# Altium footprint library mfmc_footprints.PcbLib: 156 footprints (part 3 of 10)
Each footprint in its own frame and in the unit in brackets; x right, y up, seen from the top. Pads: shape width x height; smd on the part's side, far side on the other; paste and mask are expansions set on the pad; w line width, h text height; cw(c..) or ccw(c..) is an arc to the next point about the centre after c.
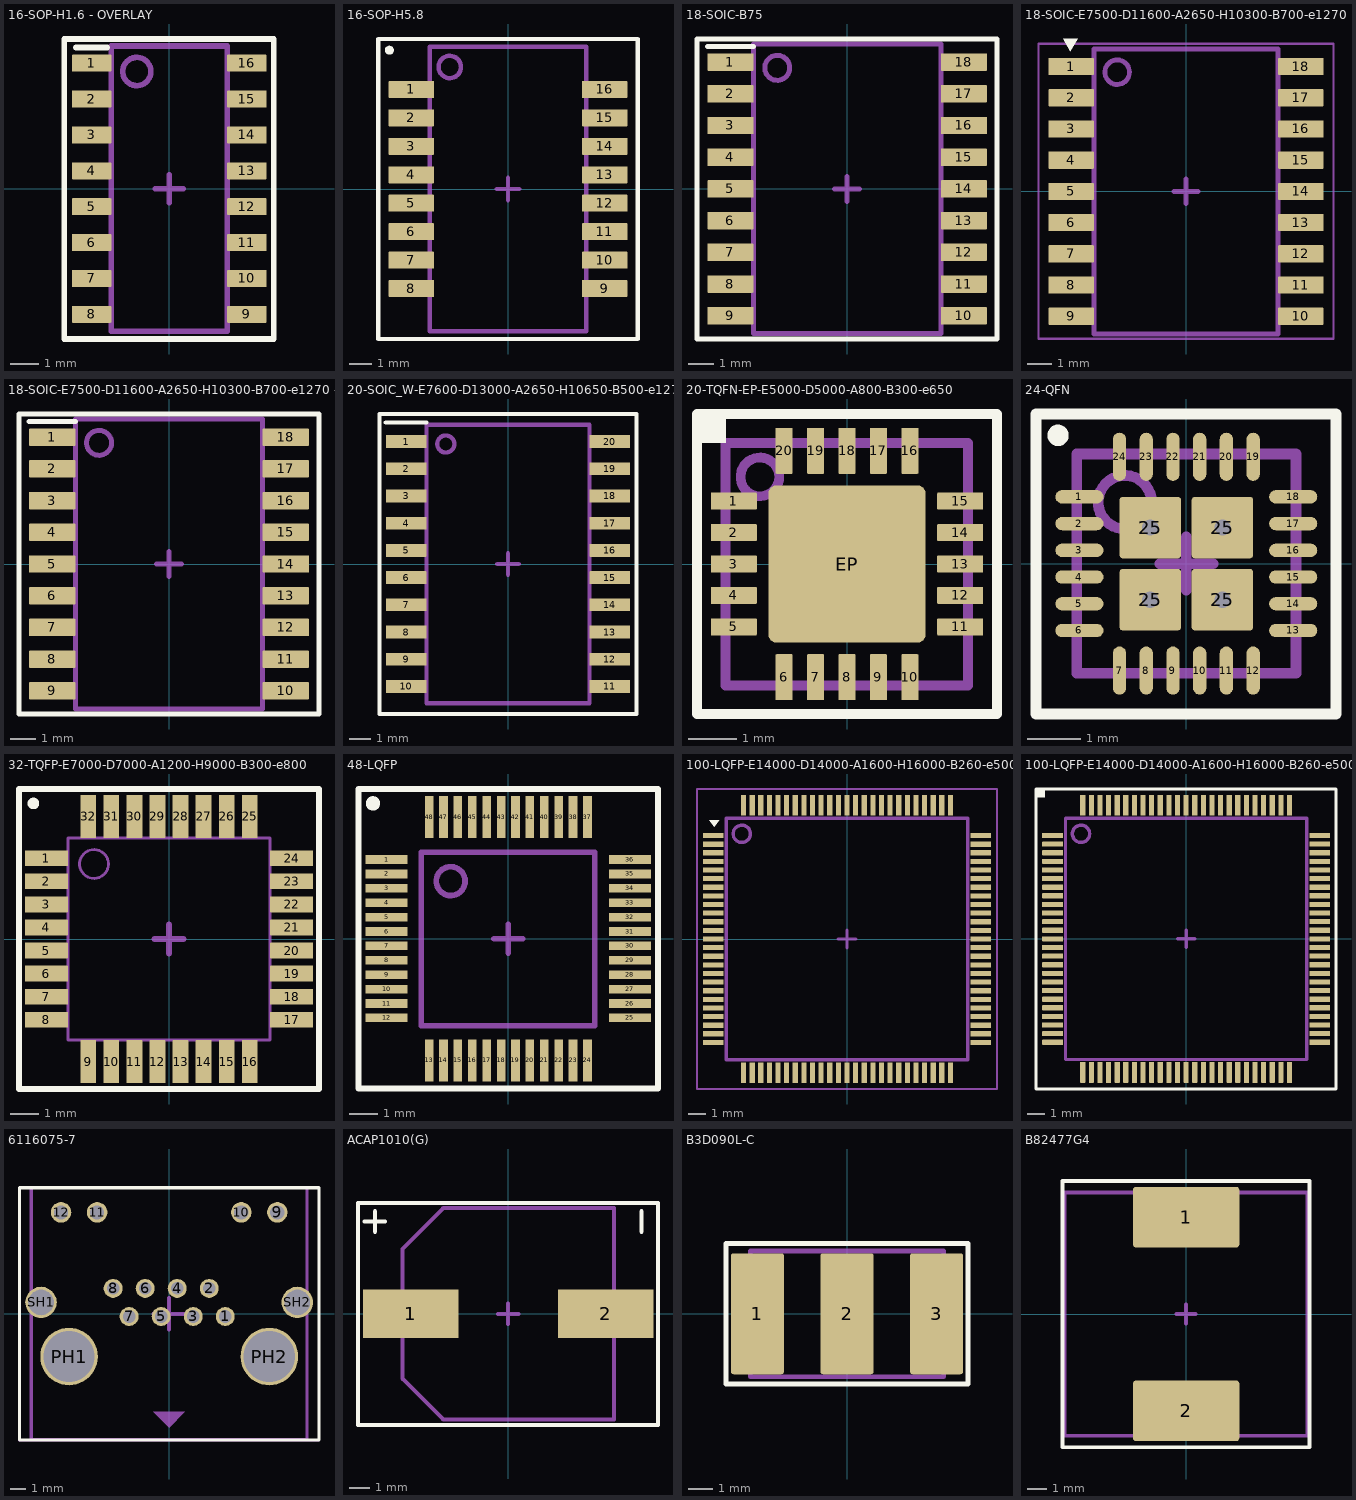
[diagram p2: the footprints below, top view; thin cyan lines are the x and y axes]

## 16-SOP-H1.6 - OVERLAY [mm] "TSOP, 16-Leads, Body 9,90x3,90mm, Pitch 1,27mm, IPC Medium Density"
height 1.6
pads (16):
  rrect10% 1.4x0.6 smd: 1(-2.75,4.445) 2(-2.75,3.175) 3(-2.75,1.905) 4(-2.75,0.635) 5(-2.75,-0.635) 6(-2.75,-1.905) 7(-2.75,-3.175) 8(-2.75,-4.445) 9(2.75,-4.445) 10(2.75,-3.175) 11(2.75,-1.905) 12(2.75,-0.635) 13(2.75,0.635) 14(2.75,1.905) 15(2.75,3.175) 16(2.75,4.445)
Top Overlay:
  lines w0.2: -3.3,5 -2.2,5 ; -3.719,-5.319 -3.719,5.3 3.7,5.3 3.7,-5.319 -3.719,-5.319
Top Courtyard:
  lines w0.1: -3.7,-5.3 -3.7,5.3 3.7,5.3 3.7,-5.3 -3.7,-5.3
  lines w0.2: -0.5,0 0.5,0 ; 0,-0.5 0,0.5
Top Assembly:
  circle w0.2: c-1.15,4.15 r0.5
  lines w0.2: -2.05,-5.05 2.05,-5.05 2.05,5.05 -2.05,5.05 -2.05,-5.05
Top Designator (Mech10):
  text ".Designator" at -7.627,-0.517 h1.52
3D body "TSOP127P600X160-16N.step": height 1.6, standoff 0, extent -3,-5.05 3,5.05

## 16-SOP-H5.8 [mm] "SOP, 16-Leads, Body 12,70x7,00mm, Pitch 1,27mm, IPC Medium Density"
height 5.8
pads (16):
  rrect10% 2.03x0.76 smd: 1(-4.32,4.445) 2(-4.32,3.175) 3(-4.32,1.905) 4(-4.32,0.635) 5(-4.32,-0.635) 6(-4.32,-1.905) 7(-4.32,-3.175) 8(-4.32,-4.445) 9(4.32,-4.445) 10(4.32,-3.175) 11(4.32,-1.905) 12(4.32,-0.635) 13(4.32,0.635) 14(4.32,1.905) 15(4.32,3.175) 16(4.32,4.445)
Top Overlay:
  circle w0.2: c-5.3,6.2 r0.1
  lines w0.2: -5.8,-6.7 5.8,-6.7 5.8,6.7 -5.8,6.7 -5.8,-6.7
Top Courtyard:
  lines w0.1: -5.8,-6.7 -5.8,6.7 5.8,6.7 5.8,-6.7 -5.8,-6.7
  lines w0.2: -0.5,0 0.5,0 ; 0,-0.5 0,0.5
Top Assembly:
  circle w0.2: c-2.6,5.45 r0.5
  lines w0.2: -3.5,-6.35 3.5,-6.35 3.5,6.35 -3.5,6.35 -3.5,-6.35
Top Designator (Mech10):
  text ".Designator" at -7.618,-0.508 h1.52
3D body "SOP127P950X580-16N.step": height 5.8, standoff 0, extent -4.75,-6.35 4.75,6.35

## 18-SOIC-B75 [mm] "SOIC, 18-Leads, Body 11,60x7,50mm, Pitch 1,27mm, IPC Medium Density"
height 2.65
pads (18):
  rrect10% 1.85x0.7 smd: 1(-4.675,5.08) 2(-4.675,3.81) 3(-4.675,2.54) 4(-4.675,1.27) 5(-4.675,0) 6(-4.675,-1.27) 7(-4.675,-2.54) 8(-4.675,-3.81) 9(-4.675,-5.08) 10(4.675,-5.08) 11(4.675,-3.81) 12(4.675,-2.54) 13(4.675,-1.27) 14(4.675,0) 15(4.675,1.27) 16(4.675,2.54) 17(4.675,3.81) 18(4.675,5.08)
Top Overlay:
  lines w0.2: -5.6,5.7 -3.75,5.7 ; -6.013,-6.013 6,-6.013 6,6 -6.013,6 -6.013,-6.013
Top Courtyard:
  lines w0.1: -6,-6 -6,6 6,6 6,-6 -6,-6
  lines w0.2: -0.5,0 0.5,0 ; 0,-0.5 0,0.5
Top Assembly:
  circle w0.2: c-2.8,4.85 r0.5
  lines w0.2: -3.75,-5.8 -3.75,5.8 3.75,5.8 3.75,-5.8 -3.75,-5.8
Top Designator (Mech10):
  text ".Designator" at -7.624,-0.514 h1.52
3D body "SOIC127P1030X265-18N.step": height 2.65, standoff 0, extent -5.15,-5.8 5.15,5.8

## 18-SOIC-E7500-D11600-A2650-H10300-B700-e1270 [mm] "SOIC, 18-Leads, Body 11,60x7,50mm, Pitch 1,27mm, IPC Medium Density"
height 2.65
pads (18):
  rrect10% 1.85x0.7 smd: 1(-4.675,5.08) 2(-4.675,3.81) 3(-4.675,2.54) 4(-4.675,1.27) 5(-4.675,0) 6(-4.675,-1.27) 7(-4.675,-2.54) 8(-4.675,-3.81) 9(-4.675,-5.08) 10(4.675,-5.08) 11(4.675,-3.81) 12(4.675,-2.54) 13(4.675,-1.27) 14(4.675,0) 15(4.675,1.27) 16(4.675,2.54) 17(4.675,3.81) 18(4.675,5.08)
Top Overlay:
  region: -4.7,5.7 -5,6.2 -4.4,6.2
Top Courtyard:
  lines w0.1: -6,-6 -6,6 6,6 6,-6 -6,-6
  lines w0.2: -0.5,0 0.5,0 ; 0,-0.5 0,0.5
Top Assembly:
  circle w0.2: c-2.8,4.85 r0.5
  lines w0.2: -3.75,-5.8 -3.75,5.8 3.75,5.8 3.75,-5.8 -3.75,-5.8
Top Designator (Mech10):
  text ".Designator" at -7.618,-0.433 h1.52
3D body "SOIC127P1030X265-18N.step": height 2.65, standoff 0, extent -5.15,-5.8 5.15,5.8

## 18-SOIC-E7500-D11600-A2650-H10300-B700-e1270 - OVERLAY [mm] "SOIC, 18-Leads, Body 11,60x7,50mm, Pitch 1,27mm, IPC Medium Density"
height 2.65
pads (18):
  rrect10% 1.85x0.7 smd: 1(-4.675,5.08) 2(-4.675,3.81) 3(-4.675,2.54) 4(-4.675,1.27) 5(-4.675,0) 6(-4.675,-1.27) 7(-4.675,-2.54) 8(-4.675,-3.81) 9(-4.675,-5.08) 10(4.675,-5.08) 11(4.675,-3.81) 12(4.675,-2.54) 13(4.675,-1.27) 14(4.675,0) 15(4.675,1.27) 16(4.675,2.54) 17(4.675,3.81) 18(4.675,5.08)
Top Overlay:
  lines w0.2: -5.6,5.7 -3.75,5.7 ; -6,-6 6,-6 6,6 -6,6 -6,-6
Top Courtyard:
  lines w0.1: -6,-6 6,-6 6,6 -6,6 -6,-6
  lines w0.2: -0.5,0 0.5,0 ; 0,-0.5 0,0.5
Top Assembly:
  circle w0.2: c-2.8,4.85 r0.5
  lines w0.2: -3.75,-5.8 3.75,-5.8 3.75,5.8 -3.75,5.8 -3.75,-5.8
Top Designator (Mech10):
  text ".Designator" at -7.618,-0.508 h1.52
3D body "SOIC127P1030X265-18N.step": height 2.65, standoff 0, extent -5.15,-5.8 5.15,5.8

## 20-SOIC_W-E7600-D13000-A2650-H10650-B500-e1270 [mm] "SOIC, 20-Leads, Body 12,80x7,50mm, Pitch 1,27mm, IPC Medium Density"
height 2.65
pads (20):
  rrect10% 1.9x0.6 smd: 1(-4.75,5.715) 2(-4.75,4.445) 3(-4.75,3.175) 4(-4.75,1.905) 5(-4.75,0.635) 6(-4.75,-0.635) 7(-4.75,-1.905) 8(-4.75,-3.175) 9(-4.75,-4.445) 10(-4.75,-5.715) 11(4.75,-5.715) 12(4.75,-4.445) 13(4.75,-3.175) 14(4.75,-1.905) 15(4.75,-0.635) 16(4.75,0.635) 17(4.75,1.905) 18(4.75,3.175) 19(4.75,4.445) 20(4.75,5.715)
Top Overlay:
  lines w0.2: -5.7,6.6 -3.8,6.6 ; -6,-7 6,-7 6,7 -6,7 -6,-7
Top Courtyard:
  lines w0.1: -6,-7 6,-7 6,7 -6,7 -6,-7
  lines w0.2: -0.5,0 0.5,0 ; 0,-0.5 0,0.5
Top Assembly:
  circle w0.2: c-2.9,5.6 r0.4
  lines w0.2: -3.8,-6.5 3.8,-6.5 3.8,6.5 -3.8,6.5 -3.8,-6.5
Top Designator (Mech10):
  text ".Designator" at -7.618,-0.508 h1.52
3D body "20-SOIC_W-E7600-D13000-A2650-H10650-B500-e1270.step": height 2.65, standoff 0, extent -5.162,-6.5 5.162,6.5

## 20-TQFN-EP-E5000-D5000-A800-B300-e650 [mm] "Thin QFN 5x5x0.75mm 20 leads"
height 0.8
pads (21):
  rrect10% 0.95x0.35 smd: 1(-2.34,1.3) 2(-2.34,0.65) 3(-2.34,0) 4(-2.34,-0.65) 5(-2.34,-1.3) 11(2.34,-1.3) 12(2.34,-0.65) 13(2.34,0) 14(2.34,0.65) 15(2.34,1.3)
  rrect10% 0.35x0.95 smd: 6(-1.3,-2.34) 7(-0.65,-2.34) 8(0,-2.34) 9(0.65,-2.34) 10(1.3,-2.34) 16(1.3,2.34) 17(0.65,2.34) 18(0,2.34) 19(-0.65,2.34) 20(-1.3,2.34)
  rrect10% 3.25x3.25 smd: EP(0,0)
Top Overlay:
  rectangle: -3.1,2.5 -2.5,3.1
  lines w0.2: -3.1,-3.1 -3.1,3.1 3.1,3.1 3.1,-3.1 -3.1,-3.1
Top Courtyard:
  lines w0.1: -3.1,-3.1 -3.1,3.1 3.1,3.1 3.1,-3.1 -3.1,-3.1
  lines w0.2: -0.5,0 0.5,0 ; 0,-0.5 0,0.5
Top Assembly:
  circle w0.2: c-1.8,1.8 r0.4
  lines w0.2: -2.513,-2.513 2.5,-2.513 2.5,2.5 -2.513,2.5 -2.513,-2.513
Top Designator (Mech10):
  text ".Designator" at -7.618,-0.508 h1.52
3D body "User Library-Maxim_TQFN20.STEP": height 0.76, standoff 0.01, extent -2.51,-2.51 2.51,2.51

## 24-QFN [mm] "QFN, 24-Leads, Body 4,00x4,00mm, Pitch 0,50mm, Thermal Pad 2,50x2,50mm, IPC Medium Density"
height 0.85
pads (28):
  oval 0.9x0.25 smd: 1(-2,1.25) 2(-2,0.75) 3(-2,0.25) 4(-2,-0.25) 5(-2,-0.75) 6(-2,-1.25) 13(2,-1.25) 14(2,-0.75) 15(2,-0.25) 16(2,0.25) 17(2,0.75) 18(2,1.25)
  oval 0.25x0.9 smd: 7(-1.25,-2) 8(-0.75,-2) 9(-0.25,-2) 10(0.25,-2) 11(0.75,-2) 12(1.25,-2) 19(1.25,2) 20(0.75,2) 21(0.25,2) 22(-0.25,2) 23(-0.75,2) 24(-1.25,2)
  rrect10% 1.15x1.15 smd: 25(-0.675,-0.675) 25(-0.675,0.675) 25(0.675,-0.675) 25(0.675,0.675)
via 0.675,0.675 diameter 0.7 hole 0.3
via 0.675,-0.675 diameter 0.7 hole 0.3
via -0.675,-0.675 diameter 0.7 hole 0.3
via -0.675,0.675 diameter 0.7 hole 0.3
Top Overlay:
  circle w0.2: c-2.4,2.4 r0.1
  lines w0.2: -2.813,-2.813 2.8,-2.813 2.8,2.8 -2.813,2.8 -2.813,-2.813
Top Courtyard:
  lines w0.1: -2.8,-2.8 2.8,-2.8 2.8,2.8 -2.8,2.8 -2.8,-2.8
  lines w0.2: -0.5,0 0.5,0 ; 0,-0.5 0,0.5
Top Assembly:
  circle w0.2: c-1.15,1.15 r0.5
  lines w0.2: -2.05,-2.05 2.05,-2.05 2.05,2.05 -2.05,2.05 -2.05,-2.05
Top Designator (Mech10):
  text ".Designator" at -7.624,-0.514 h1.52
3D body "QFN50P400X400X85_HS-25N.step": height 0.85, standoff 0, extent -2.1,-2.1 2.1,2.1

## 32-TQFP-E7000-D7000-A1200-H9000-B300-e800 [mm] "TQFP, 32-Leads, Body 7,00x7,00mm, Pitch 0,80mm, IPC Medium Density"
height 1.2
pads (32):
  rrect10% 1.5x0.55 smd: 1(-4.25,2.8) 2(-4.25,2) 3(-4.25,1.2) 4(-4.25,0.4) 5(-4.25,-0.4) 6(-4.25,-1.2) 7(-4.25,-2) 8(-4.25,-2.8) 17(4.25,-2.8) 18(4.25,-2) 19(4.25,-1.2) 20(4.25,-0.4) 21(4.25,0.4) 22(4.25,1.2) 23(4.25,2) 24(4.25,2.8)
  rrect10% 0.55x1.5 smd: 9(-2.8,-4.25) 10(-2,-4.25) 11(-1.2,-4.25) 12(-0.4,-4.25) 13(0.4,-4.25) 14(1.2,-4.25) 15(2,-4.25) 16(2.8,-4.25) 25(2.8,4.25) 26(2,4.25) 27(1.2,4.25) 28(0.4,4.25) 29(-0.4,4.25) 30(-1.2,4.25) 31(-2,4.25) 32(-2.8,4.25)
Top Overlay:
  circle w0.2: c-4.7,4.7 r0.1
  lines w0.2: -5.2,-5.2 5.2,-5.2 5.2,5.2 -5.2,5.2 -5.2,-5.2
Top Courtyard:
  lines w0.1: -5.2,-5.2 -5.2,5.2 5.2,5.2 5.2,-5.2 -5.2,-5.2
  lines w0.2: -0.5,0 0.5,0 ; 0,-0.5 0,0.5
Top Assembly:
  circle w0.1: c-2.6,2.6 r0.5
  lines w0.1: -3.5,-3.5 -3.5,3.5 3.5,3.5 3.5,-3.5 -3.5,-3.5
Top Designator (Mech10):
  text ".Designator" at -7.618,-0.508 h1.52
3D body "32-TQFP-E7000-D7000-A1200-H9000-B300-e800.step": height 1.05, standoff 0, extent -4.625,-4.625 4.625,4.625

## 48-LQFP [mm] "TSQFP, 48-Leads, Body 7,00x7,00mm, Pitch 0,50mm, IPC Medium Density"
height 1.6
pads (48):
  rect 1.45x0.3 smd: 1(-4.225,2.75) 2(-4.225,2.25) 3(-4.225,1.75) 4(-4.225,1.25) 5(-4.225,0.75) 6(-4.225,0.25) 7(-4.225,-0.25) 8(-4.225,-0.75) 9(-4.225,-1.25) 10(-4.225,-1.75) 11(-4.225,-2.25) 12(-4.225,-2.75) 25(4.225,-2.75) 26(4.225,-2.25) 27(4.225,-1.75) 28(4.225,-1.25) 29(4.225,-0.75) 30(4.225,-0.25) 31(4.225,0.25) 32(4.225,0.75) 33(4.225,1.25) 34(4.225,1.75) 35(4.225,2.25) 36(4.225,2.75)
  rect 0.3x1.45 smd: 13(-2.75,-4.225) 14(-2.25,-4.225) 15(-1.75,-4.225) 16(-1.25,-4.225) 17(-0.75,-4.225) 18(-0.25,-4.225) 19(0.25,-4.225) 20(0.75,-4.225) 21(1.25,-4.225) 22(1.75,-4.225) 23(2.25,-4.225) 24(2.75,-4.225) 37(2.75,4.225) 38(2.25,4.225) 39(1.75,4.225) 40(1.25,4.225) 41(0.75,4.225) 42(0.25,4.225) 43(-0.25,4.225) 44(-0.75,4.225) 45(-1.25,4.225) 46(-1.75,4.225) 47(-2.25,4.225) 48(-2.75,4.225)
Top Overlay:
  circle w0.25: c-4.7,4.7 r0.125
  lines w0.2: -5.2,-5.2 -5.2,5.2 5.2,5.2 5.2,-5.2 -5.2,-5.2
Top Courtyard:
  lines w0.1: -5.219,-5.219 5.2,-5.219 5.2,5.2 -5.219,5.2 -5.219,-5.219
  lines w0.2: -0.5,0 0.5,0 ; 0,-0.5 0,0.5
Top Assembly:
  circle w0.2: c-2,2 r0.5
  lines w0.2: -3.019,-3.019 3,-3.019 3,3 -3.019,3 -3.019,-3.019
Top Designator (Mech10):
  text ".Designator" at -7.618,-0.508 h1.52
3D body "TSQFP50P900X900X160-48N.step": height 1.6, standoff 0, extent -4.5,-4.5 4.5,4.5

## 100-LQFP-E14000-D14000-A1600-H16000-B260-e500 [mm] "TSQFP, 100-Leads, Body 14,00x14,00mm, Pitch 0,50mm, IPC Medium Density"
height 1.6
pads (100):
  rrect10% 1.2x0.3 smd: 1(-7.75,6) 2(-7.75,5.5) 3(-7.75,5) 4(-7.75,4.5) 5(-7.75,4) 6(-7.75,3.5) 7(-7.75,3) 8(-7.75,2.5) 9(-7.75,2) 10(-7.75,1.5) 11(-7.75,1) 12(-7.75,0.5) 13(-7.75,0) 14(-7.75,-0.5) 15(-7.75,-1) 16(-7.75,-1.5) 17(-7.75,-2) 18(-7.75,-2.5) 19(-7.75,-3) 20(-7.75,-3.5) 21(-7.75,-4) 22(-7.75,-4.5) 23(-7.75,-5) 24(-7.75,-5.5) 25(-7.75,-6) 51(7.75,-6) 52(7.75,-5.5) 53(7.75,-5) 54(7.75,-4.5) 55(7.75,-4) 56(7.75,-3.5) 57(7.75,-3) 58(7.75,-2.5) 59(7.75,-2) 60(7.75,-1.5) 61(7.75,-1) 62(7.75,-0.5) 63(7.75,0) 64(7.75,0.5) 65(7.75,1) 66(7.75,1.5) 67(7.75,2) 68(7.75,2.5) 69(7.75,3) 70(7.75,3.5) 71(7.75,4) 72(7.75,4.5) 73(7.75,5) 74(7.75,5.5) 75(7.75,6)
  rrect10% 0.3x1.2 smd: 26(-6,-7.75) 27(-5.5,-7.75) 28(-5,-7.75) 29(-4.5,-7.75) 30(-4,-7.75) 31(-3.5,-7.75) 32(-3,-7.75) 33(-2.5,-7.75) 34(-2,-7.75) 35(-1.5,-7.75) 36(-1,-7.75) 37(-0.5,-7.75) 38(0,-7.75) 39(0.5,-7.75) 40(1,-7.75) 41(1.5,-7.75) 42(2,-7.75) 43(2.5,-7.75) 44(3,-7.75) 45(3.5,-7.75) 46(4,-7.75) 47(4.5,-7.75) 48(5,-7.75) 49(5.5,-7.75) 50(6,-7.75) 76(6,7.75) 77(5.5,7.75) 78(5,7.75) 79(4.5,7.75) 80(4,7.75) 81(3.5,7.75) 82(3,7.75) 83(2.5,7.75) 84(2,7.75) 85(1.5,7.75) 86(1,7.75) 87(0.5,7.75) 88(0,7.75) 89(-0.5,7.75) 90(-1,7.75) 91(-1.5,7.75) 92(-2,7.75) 93(-2.5,7.75) 94(-3,7.75) 95(-3.5,7.75) 96(-4,7.75) 97(-4.5,7.75) 98(-5,7.75) 99(-5.5,7.75) 100(-6,7.75)
Top Overlay:
  region: -7.7,6.5 -8,6.9 -7.4,6.9
Top Courtyard:
  lines w0.1: -8.7,-8.7 8.7,-8.7 8.7,8.7 -8.7,8.7 -8.7,-8.7
  lines w0.2: -0.5,0 0.5,0 ; 0,-0.5 0,0.5
Top Assembly:
  circle w0.2: c-6.1,6.1 r0.5
  lines w0.2: -7,-7 7,-7 7,7 -7,7 -7,-7
Top Designator (Mech10):
  text ".Designator" at -7.618,-0.508 h1.52
3D body "TSQFP50P1600X1600X160-100N.step": height 1.6, standoff 0, extent -8,-8 8,8

## 100-LQFP-E14000-D14000-A1600-H16000-B260-e500-OVERLAY-E17400-D17400 [mm] "TSQFP, 100-Leads, Body 14,00x14,00mm, Pitch 0,50mm, IPC Medium Density"
height 1.6
pads (100):
  rrect10% 1.2x0.3 smd: 1(-7.75,6) 2(-7.75,5.5) 3(-7.75,5) 4(-7.75,4.5) 5(-7.75,4) 6(-7.75,3.5) 7(-7.75,3) 8(-7.75,2.5) 9(-7.75,2) 10(-7.75,1.5) 11(-7.75,1) 12(-7.75,0.5) 13(-7.75,0) 14(-7.75,-0.5) 15(-7.75,-1) 16(-7.75,-1.5) 17(-7.75,-2) 18(-7.75,-2.5) 19(-7.75,-3) 20(-7.75,-3.5) 21(-7.75,-4) 22(-7.75,-4.5) 23(-7.75,-5) 24(-7.75,-5.5) 25(-7.75,-6) 51(7.75,-6) 52(7.75,-5.5) 53(7.75,-5) 54(7.75,-4.5) 55(7.75,-4) 56(7.75,-3.5) 57(7.75,-3) 58(7.75,-2.5) 59(7.75,-2) 60(7.75,-1.5) 61(7.75,-1) 62(7.75,-0.5) 63(7.75,0) 64(7.75,0.5) 65(7.75,1) 66(7.75,1.5) 67(7.75,2) 68(7.75,2.5) 69(7.75,3) 70(7.75,3.5) 71(7.75,4) 72(7.75,4.5) 73(7.75,5) 74(7.75,5.5) 75(7.75,6)
  rrect10% 0.3x1.2 smd: 26(-6,-7.75) 27(-5.5,-7.75) 28(-5,-7.75) 29(-4.5,-7.75) 30(-4,-7.75) 31(-3.5,-7.75) 32(-3,-7.75) 33(-2.5,-7.75) 34(-2,-7.75) 35(-1.5,-7.75) 36(-1,-7.75) 37(-0.5,-7.75) 38(0,-7.75) 39(0.5,-7.75) 40(1,-7.75) 41(1.5,-7.75) 42(2,-7.75) 43(2.5,-7.75) 44(3,-7.75) 45(3.5,-7.75) 46(4,-7.75) 47(4.5,-7.75) 48(5,-7.75) 49(5.5,-7.75) 50(6,-7.75) 76(6,7.75) 77(5.5,7.75) 78(5,7.75) 79(4.5,7.75) 80(4,7.75) 81(3.5,7.75) 82(3,7.75) 83(2.5,7.75) 84(2,7.75) 85(1.5,7.75) 86(1,7.75) 87(0.5,7.75) 88(0,7.75) 89(-0.5,7.75) 90(-1,7.75) 91(-1.5,7.75) 92(-2,7.75) 93(-2.5,7.75) 94(-3,7.75) 95(-3.5,7.75) 96(-4,7.75) 97(-4.5,7.75) 98(-5,7.75) 99(-5.5,7.75) 100(-6,7.75)
Top Overlay:
  rectangle: -8.7,8.2 -8.2,8.7
  lines w0.2: -8.713,-8.713 8.7,-8.713 8.7,8.7 -8.713,8.7 -8.713,-8.713
Top Courtyard:
  lines w0.1: -8.7,-8.7 8.7,-8.7 8.7,8.7 -8.7,8.7 -8.7,-8.7
  lines w0.2: -0.5,0 0.5,0 ; 0,-0.5 0,0.5
Top Assembly:
  circle w0.2: c-6.1,6.1 r0.5
  lines w0.2: -7,-7 7,-7 7,7 -7,7 -7,-7
Top Designator (Mech10):
  text ".Designator" at -7.624,-0.514 h1.52
3D body "TSQFP50P1600X1600X160-100N.step": height 1.6, standoff 0, extent -8,-8 8,8

## 6116075-7 [mm] "RJ45 Connectors, RJ45, Single Port, 1 x 1, RJ Type Jacks & Plugs, Standard Connector Contact Density, Jack, Shielded, Cat 5, Inverted - Latch Up"
height 14
pads (16):
  round 1.2 hole 0.8: 1(3.556,-0.16) 2(2.54,1.62) 3(1.524,-0.16) 4(0.508,1.62) 5(-0.508,-0.16) 6(-1.524,1.62) 7(-2.54,-0.16) 8(-3.556,1.62)
  round 1.3 hole 0.9: 9(6.858,6.444) 10(4.572,6.444) 11(-4.572,6.444) 12(-6.858,6.444)
  round 3.65 hole 3.25: PH1(-6.35,-2.7) PH2(6.35,-2.7)
  round 2 hole 1.6: SH1(-8.128,0.73) SH2(8.128,0.73)
Top Overlay:
  lines w0.2: -9.5,-8 9.5,-8 9.5,8 -9.5,8 -9.5,-8
Top Courtyard:
  lines w0.1: -9.524,-8.024 9.5,-8.024 9.5,8 -9.524,8 -9.524,-8.024
  lines w0.254: -1,0 1,0 ; 0,-1 0,1
Top Assembly:
  region: 0,-7.2 -1,-6.2 1,-6.2
  lines w0.2: -8.75,-7.98 8.75,-7.98 8.75,8.02 -8.75,8.02 -8.75,-7.98
Top Designator (Mech10):
  text ".Designator" at -7.618,-0.921 h1.52
3D body "c-6116075-04-a-3d.stp": height 13.03, standoff -4.5, extent -8.323,-8.946 8.314,7.767

## ACAP1010(G) [mm] "Aluminum Electrolytic Capacitor, Body 10,30x10,30x10,50mm, IPC Low Density"
height 10.5
pads (2):
  rect 4.65x2.35 smd: 1(-4.75,0) 2(4.75,0)
Top Overlay:
  lines w0.2: -7,4.5 -6,4.5 ; -6.5,4 -6.5,5 ; 6.5,4 6.5,5 ; -7.319,-5.419 7.3,-5.419 7.3,5.4 -7.319,5.4 -7.319,-5.419
Top Courtyard:
  lines w0.1: -7.3,-5.4 -7.3,5.4 7.3,5.4 7.3,-5.4 -7.3,-5.4
  lines w0.2: -0.5,0 0.5,0 ; 0,-0.5 0,0.5
Top Assembly:
  lines w0.2: -5.15,-3.163 -3.163,-5.15 5.15,-5.15 5.15,5.15 -3.163,5.15 -5.15,3.162 -5.15,-3.163
Top Designator (Mech10):
  text ".Designator" at -7.627,-0.517 h1.52
3D body "CAPAE120103X105M.step": height 10.5, standoff 0, extent -6,-5.15 6,5.15

## B3D090L-C [mm]
height 6.1
pads (3):
  rrect10% 2.2x5 smd: 1(-3.7,0) 2(0,0) 3(3.7,0)
Top Overlay:
  lines w0.2: -5,-2.9 -5,2.9 5,2.9 5,-2.9 -5,-2.9
Top Courtyard:
  lines w0.1: -5.019,-2.919 5,-2.919 5,2.9 -5.019,2.9 -5.019,-2.919
  lines w0.2: -0.5,0 0.5,0 ; 0,-0.5 0,0.5
Top Assembly:
  circle w0.2: c-3.2,0 r0.4
  lines w0.2: -4,-2.6 -4,2.6 4,2.6 4,-2.6 -4,-2.6
Top Designator (Mech10):
  text ".Designator" at -7.618,-0.508 h1.52
3D body "B3D090L-C.STEP": height 5.5, standoff 0, extent -3.8,-2.5 3.8,2.5

## B82477G4 [mm]
height 8
pads (2):
  rrect10% 5.6x3.2 smd: 1(0,5.1) 2(0,-5.1)
Top Overlay:
  lines w0.2: -6.513,-7.013 6.5,-7.013 6.5,7 -6.513,7 -6.513,-7.013
Top Courtyard:
  lines w0.1: -6.513,-7.013 6.5,-7.013 6.5,7 -6.513,7 -6.513,-7.013
  lines w0.2: -0.5,0 0.5,0 ; 0,-0.5 0,0.5
Top Assembly:
  lines w0.2: -6.413,-6.413 6.4,-6.413 6.4,6.4 -6.413,6.4 -6.413,-6.413
Top Designator (Mech10):
  text ".Designator" at -7.624,-0.514 h1.52
3D body "User Library-b82477g4.STEP": height 8, standoff 0, extent -6.4,-6.4 6.4,6.4